# Altium footprint library LUMI_Handy_Soldering_LIB.PcbLib: 562 footprints (part 11 of 36)
Each footprint in its own frame and in the unit in brackets; x right, y up, seen from the top. Pads: shape width x height; smd on the part's side, far side on the other; paste and mask are expansions set on the pad; w line width, h text height; cw(c..) or ccw(c..) is an arc to the next point about the centre after c.
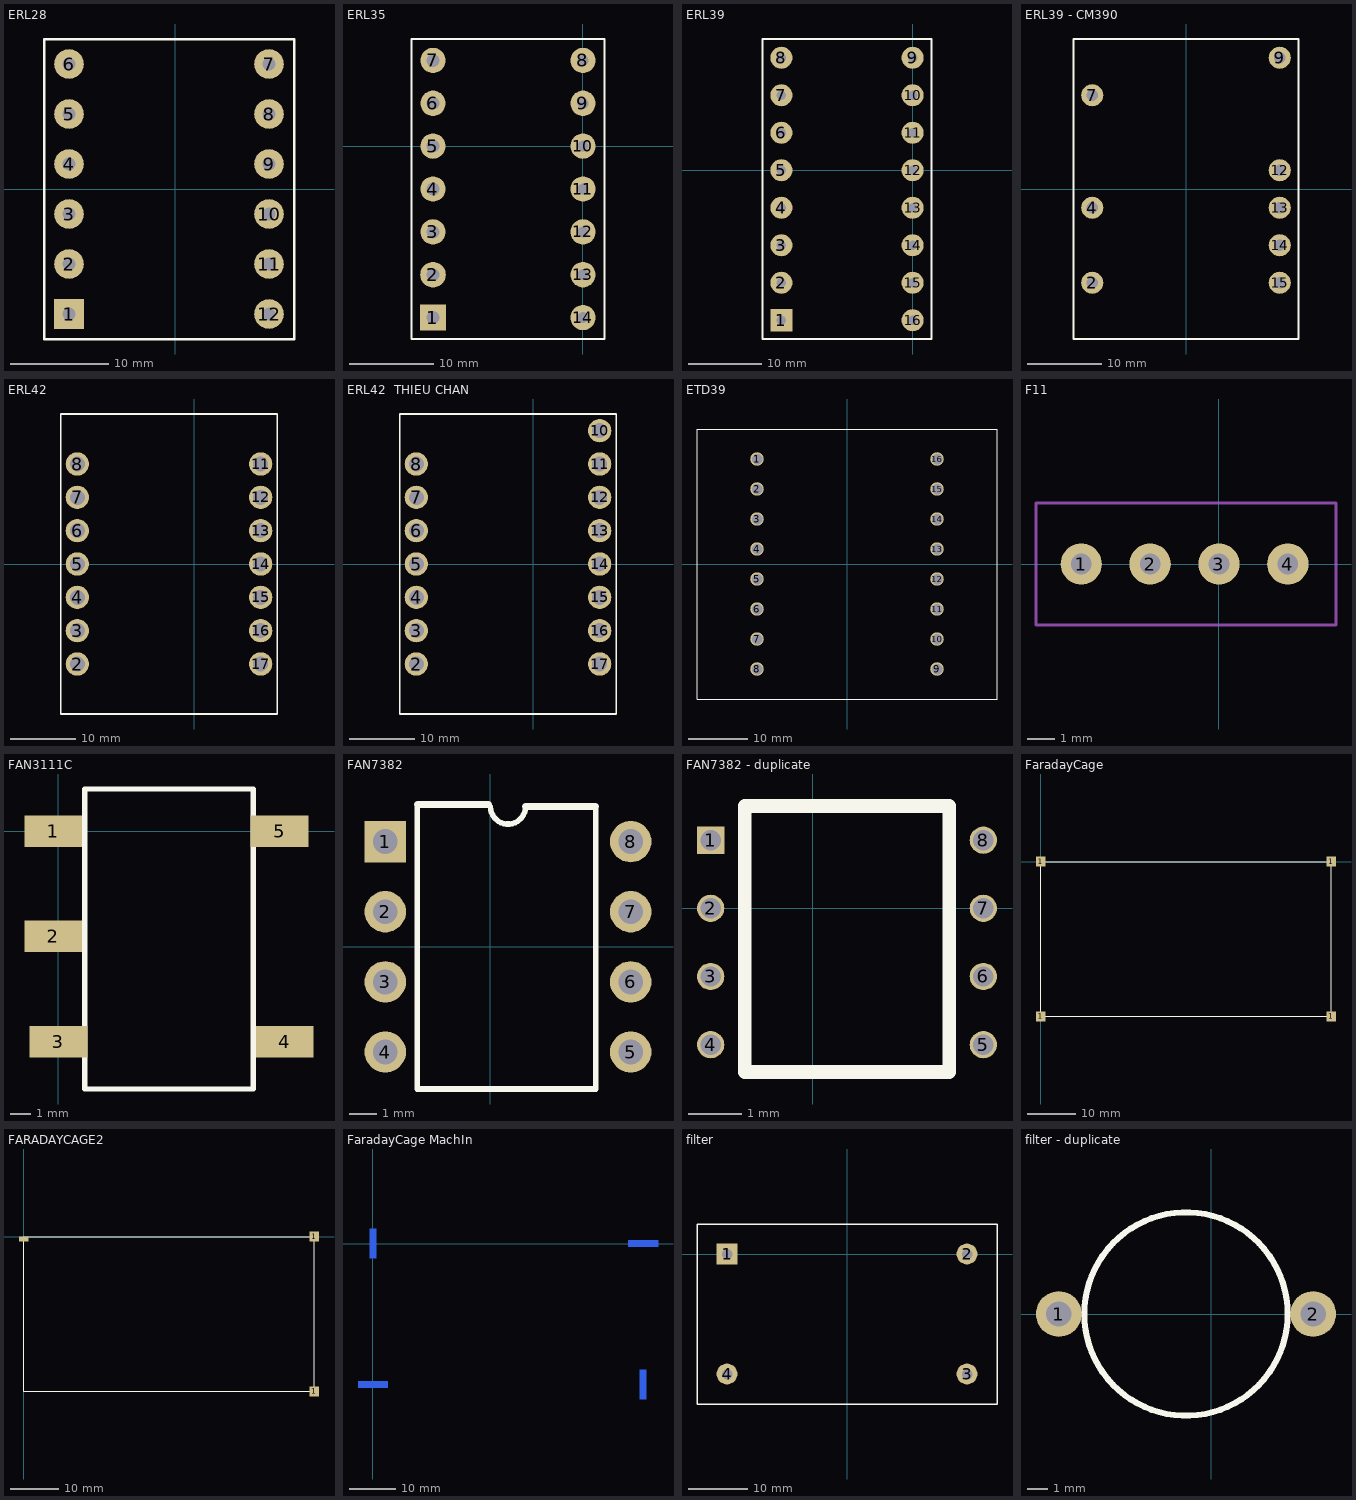
[diagram p10: the footprints below, top view; thin cyan lines are the x and y axes]

## ERL28 [mm]
pads (12):
  rect 3x3 hole 1.3: 1(-10.795,-12.7)
  round 3 hole 1.3: 2(-10.795,-7.62) 3(-10.795,-2.54) 4(-10.795,2.54) 5(-10.795,7.62) 6(-10.795,12.7) 7(9.525,12.7) 8(9.525,7.62) 9(9.525,2.54) 10(9.525,-2.54) 11(9.525,-7.62) 12(9.525,-12.7)
Top Overlay:
  lines w0.254: -13.335,-15.24 -13.335,15.24 12.065,15.24 12.065,-15.24 -13.335,-15.24
3D body: height 5.08, standoff 0, extent -7.62,-15.24 -5.715,15.24
3D body: height 5.08, standoff 0, extent 4.445,-15.24 6.35,15.24
3D body: height 10.16, standoff 5.08, extent 4.445,10.16 12.065,15.24
3D body: height 10.16, standoff 5.08, extent 4.445,5.08 12.065,10.16
3D body: height 10.16, standoff 5.08, extent 4.445,0 12.065,5.08
3D body: height 10.16, standoff 5.08, extent 4.445,-5.08 12.065,0
3D body: height 10.16, standoff 5.08, extent 4.445,-10.16 12.065,-5.08
3D body: height 10.16, standoff 5.08, extent 4.445,-15.24 12.065,-10.16
3D body: height 10.16, standoff 5.08, extent -13.335,-15.24 -5.715,-10.16
3D body: height 10.16, standoff 5.08, extent -13.335,-10.16 -5.715,-5.08
3D body: height 10.16, standoff 5.08, extent -13.335,-5.08 -5.715,0
3D body: height 10.16, standoff 5.08, extent -13.335,0 -5.715,5.08
3D body: height 10.16, standoff 5.08, extent -13.335,5.08 -5.715,10.16
3D body: height 38.1, standoff 3.81, extent -5.715,-13.97 4.445,-8.89
3D body: height 43.18, standoff 38.1, extent -5.715,-13.97 4.445,13.97
3D body: height 7.62, standoff 1.27, extent -5.715,-13.97 4.445,13.97
3D body: height 38.1, standoff 10.16, extent -9.525,-8.852 8.185,8.893
3D body: height 38.1, standoff 3.81, extent -5.715,8.89 4.445,13.97
3D body: height 7.62, standoff -2.54, extent 8.769,11.94 10.287,13.461
3D body: height 7.62, standoff -2.54, extent 8.769,6.86 10.287,8.381
3D body: height 7.62, standoff -2.54, extent 8.769,1.78 10.287,3.301
3D body: height 7.62, standoff -2.54, extent 8.769,-3.3 10.287,-1.779
3D body: height 7.62, standoff -2.54, extent 8.769,-8.38 10.287,-6.859
3D body: height 7.62, standoff -2.54, extent 8.769,-13.46 10.287,-11.939
3D body: height 7.62, standoff -2.54, extent -11.551,-13.46 -10.033,-11.939
3D body: height 7.62, standoff -2.54, extent -11.551,-8.38 -10.033,-6.859
3D body: height 7.62, standoff -2.54, extent -11.551,-3.3 -10.033,-1.779
3D body: height 7.62, standoff -2.54, extent -11.551,1.78 -10.033,3.301
3D body: height 7.62, standoff -2.54, extent -11.551,6.86 -10.033,8.381
3D body: height 7.62, standoff -2.54, extent -11.551,11.94 -10.033,13.461
3D body: height 10.16, standoff 5.08, extent -13.335,10.16 -5.715,15.24
3D body: height 10.16, standoff 7.62, extent -5.715,-8.89 4.445,8.89

## ERL35 [mm]
pads (14):
  rect 3.048x3.048 hole 1.524: 1(-17.78,-20.32)
  round 3.048 hole 1.524: 2(-17.78,-15.24)
  round 3 hole 1.524: 3(-17.78,-10.16) 4(-17.78,-5.08) 5(-17.78,0) 6(-17.78,5.08) 7(-17.78,10.16)
  round 3 hole 1.3: 8(0,10.16) 9(0,5.08) 10(0,0) 11(0,-5.08) 12(0,-10.16) 13(0,-15.24) 14(0,-20.32)
Top Overlay:
  lines w0.254: -20.32,-22.86 2.54,-22.86 2.54,12.7 -20.32,12.7 -20.32,-22.86
3D body: height 10.16, standoff 8.89, extent -13.97,-15.24 -3.81,5.08
3D body: height 36.83, standoff 8.89, extent -17.78,-14.206 0.436,4.046
3D body: height 7.62, standoff 1.27, extent -13.97,-22.86 -3.81,12.7
3D body: height 43.18, standoff 36.83, extent -13.97,-22.86 -3.81,12.7
3D body: height 43.18, standoff 1.27, extent -13.97,5.08 -3.81,12.7
3D body: height 43.18, standoff 1.27, extent -13.97,-22.86 -3.81,-15.24
3D body: height 10.16, standoff 5.08, extent -20.256,7.62 -13.907,12.7
3D body: height 7.62, standoff -2.54, extent -18.536,9.4 -17.018,10.921
3D body: height 7.62, standoff -2.54, extent -18.536,4.32 -17.018,5.841
3D body: height 7.62, standoff -2.54, extent -18.536,-0.76 -17.018,0.761
3D body: height 7.62, standoff -2.54, extent -18.536,-5.84 -17.018,-4.319
3D body: height 7.62, standoff -2.54, extent -18.536,-10.92 -17.018,-9.399
3D body: height 7.62, standoff -2.54, extent -18.536,-16 -17.018,-14.479
3D body: height 7.62, standoff -2.54, extent -18.536,-21.08 -17.018,-19.559
3D body: height 7.62, standoff -2.54, extent -0.756,-21.08 0.762,-19.56
3D body: height 7.62, standoff -2.54, extent -0.756,-16 0.762,-14.48
3D body: height 7.62, standoff -2.54, extent -0.756,-10.92 0.762,-9.4
3D body: height 7.62, standoff -2.54, extent -0.756,-5.84 0.762,-4.319
3D body: height 7.62, standoff -2.54, extent -0.756,-0.76 0.762,0.761
3D body: height 7.62, standoff -2.54, extent -0.756,4.32 0.762,5.84
3D body: height 7.62, standoff -2.54, extent -0.756,9.4 0.762,10.92
3D body: height 5.08, standoff 0, extent -3.746,-22.86 -1.841,12.7
3D body: height 5.08, standoff 0, extent -15.811,-22.86 -13.906,12.7
3D body: height 10.16, standoff 5.08, extent -20.256,2.54 -13.907,7.62
3D body: height 10.16, standoff 5.08, extent -20.256,-2.54 -13.907,2.54
3D body: height 10.16, standoff 5.08, extent -20.256,-7.62 -13.907,-2.54
3D body: height 10.16, standoff 5.08, extent -20.256,-12.7 -13.907,-7.62
3D body: height 10.16, standoff 5.08, extent -20.256,-17.78 -13.907,-12.7
3D body: height 10.16, standoff 5.08, extent -20.256,-22.86 -13.907,-17.78
3D body: height 10.16, standoff 5.08, extent -3.874,-22.86 2.476,-17.78
3D body: height 10.16, standoff 5.08, extent -3.874,-17.78 2.476,-12.7
3D body: height 10.16, standoff 5.08, extent -3.873,-12.7 2.476,-7.62
3D body: height 10.16, standoff 5.08, extent -3.873,-7.62 2.476,-2.54
3D body: height 10.16, standoff 5.08, extent -3.873,-2.54 2.476,2.54
3D body: height 10.16, standoff 5.08, extent -3.874,2.54 2.476,7.62
3D body: height 10.16, standoff 5.08, extent -3.874,7.62 2.476,12.7

## ERL39 [mm]
pads (16):
  rect 3x3 hole 1.3: 1(-17.78,-20.32)
  round 3 hole 1.3: 2(-17.78,-15.24) 3(-17.78,-10.16) 4(-17.78,-5.08) 5(-17.78,0) 6(-17.78,5.08) 7(-17.78,10.16) 8(-17.78,15.24) 9(0,15.24) 10(0,10.16) 11(0,5.08) 12(0,0) 13(0,-5.08) 14(0,-10.16) 15(0,-15.24) 16(0,-20.32)
Top Overlay:
  lines w0.254: -20.32,-22.86 2.54,-22.86 2.54,17.78 -20.32,17.78 -20.32,-22.86
3D body: height 10.16, standoff 8.89, extent -13.97,-15.24 -3.81,5.08
3D body: height 38.1, standoff 10.16, extent -21.59,-15.215 3.71,10.135
3D body: height 7.62, standoff 1.27, extent -13.97,-22.86 -3.81,17.78
3D body: height 44.45, standoff 38.1, extent -13.97,-22.86 -3.81,17.78
3D body: height 43.18, standoff 1.27, extent -13.97,10.16 -3.81,17.78
3D body: height 43.18, standoff 1.27, extent -13.97,-22.86 -3.81,-15.24
3D body: height 10.16, standoff 5.08, extent -20.256,7.62 -13.907,12.7
3D body: height 7.62, standoff -2.54, extent -18.536,9.4 -17.018,10.921
3D body: height 7.62, standoff -2.54, extent -18.536,4.32 -17.018,5.841
3D body: height 7.62, standoff -2.54, extent -18.536,-0.76 -17.018,0.761
3D body: height 7.62, standoff -2.54, extent -18.536,-5.84 -17.018,-4.319
3D body: height 7.62, standoff -2.54, extent -18.536,-10.92 -17.018,-9.399
3D body: height 7.62, standoff -2.54, extent -18.536,-16 -17.018,-14.479
3D body: height 7.62, standoff -2.54, extent -18.536,-21.08 -17.018,-19.559
3D body: height 7.62, standoff -2.54, extent -0.756,-21.08 0.762,-19.56
3D body: height 7.62, standoff -2.54, extent -0.756,-16 0.762,-14.48
3D body: height 7.62, standoff -2.54, extent -0.756,-10.92 0.762,-9.4
3D body: height 7.62, standoff -2.54, extent -0.756,-5.84 0.762,-4.319
3D body: height 7.62, standoff -2.54, extent -0.756,-0.76 0.762,0.761
3D body: height 7.62, standoff -2.54, extent -0.756,4.32 0.762,5.84
3D body: height 7.62, standoff -2.54, extent -0.756,9.4 0.762,10.92
3D body: height 5.08, standoff 0, extent -3.746,-22.86 -1.841,12.7
3D body: height 5.08, standoff 0, extent -15.811,-22.86 -13.906,12.7
3D body: height 10.16, standoff 5.08, extent -20.256,2.54 -13.907,7.62
3D body: height 10.16, standoff 5.08, extent -20.256,-2.54 -13.907,2.54
3D body: height 10.16, standoff 5.08, extent -20.256,-7.62 -13.907,-2.54
3D body: height 10.16, standoff 5.08, extent -20.256,-12.7 -13.907,-7.62
3D body: height 10.16, standoff 5.08, extent -20.256,-17.78 -13.907,-12.7
3D body: height 10.16, standoff 5.08, extent -20.256,-22.86 -13.907,-17.78
3D body: height 10.16, standoff 5.08, extent -3.874,-22.86 2.476,-17.78
3D body: height 10.16, standoff 5.08, extent -3.874,-17.78 2.476,-12.7
3D body: height 10.16, standoff 5.08, extent -3.873,-12.7 2.476,-7.62
3D body: height 10.16, standoff 5.08, extent -3.873,-7.62 2.476,-2.54
3D body: height 10.16, standoff 5.08, extent -3.873,-2.54 2.476,2.54
3D body: height 10.16, standoff 5.08, extent -3.874,2.54 2.476,7.62
3D body: height 10.16, standoff 5.08, extent -3.874,7.62 2.476,12.7
3D body: height 10.16, standoff 5.08, extent -20.256,12.7 -13.907,17.78
3D body: height 10.16, standoff 5.08, extent -3.873,12.7 2.476,17.78
3D body: height 7.62, standoff -2.54, extent -18.536,-21.08 -17.018,-19.559
3D body: height 7.62, standoff -2.54, extent -0.756,-21.08 0.762,-19.559
3D body: height 7.62, standoff -2.54, extent -0.756,-21.08 0.762,-19.56
3D body: height 7.62, standoff -2.54, extent -18.536,-21.08 -17.018,-19.56
3D body: height 7.62, standoff -2.54, extent -18.536,14.48 -17.018,16
3D body: height 7.62, standoff -2.54, extent -0.756,14.48 0.762,16

## ERL39 - CM390 [mm]
pads (8):
  round 3 hole 1.524: 2(-12.7,-12.7) 4(-12.7,-2.54) 7(-12.7,12.7) 9(12.7,17.78) 12(12.7,2.54) 13(12.7,-2.54) 14(12.7,-7.62) 15(12.7,-12.7)
Top Overlay:
  lines w0.254: -15.24,-20.32 15.24,-20.32 15.24,20.32 -15.24,20.32 -15.24,-20.32

## ERL42 [mil]
pads (14):
  round 140 hole 90: 2(-700,-600) 3(-700,-400) 4(-700,-200) 5(-700,0) 6(-700,200) 7(-700,400) 8(-700,600) 11(400,600) 12(400,400) 13(400,200) 14(400,0) 15(400,-200) 16(400,-400) 17(400,-600)
Top Overlay:
  region: -720,640
  lines w10: -800,-900 -800,900 500,900 500,-900 -800,-900
3D body: height 400, standoff 200, extent -797.5,-900 -450,-700
3D body: height 400, standoff 200, extent -797.5,-700 -450,-500
3D body: height 400, standoff 200, extent -797.5,-500 -450,-300
3D body: height 400, standoff 200, extent -797.5,-300 -450,-100
3D body: height 400, standoff 200, extent -797.5,-100 -450,100
3D body: height 400, standoff 200, extent -797.5,100 -450,300
3D body: height 400, standoff 200, extent -797.5,300 -450,500
3D body: height 400, standoff 200, extent -797.5,500 -450,700
3D body: height 400, standoff 200, extent -797.5,700 -450,900
3D body: height 400, standoff 200, extent 150,-900 497.5,-700
3D body: height 400, standoff 200, extent 150,-700 497.5,-500
3D body: height 400, standoff 200, extent 150,-500 497.5,-300
3D body: height 400, standoff 200, extent 150,-300 497.5,-100
3D body: height 400, standoff 200, extent 150,-100 497.5,100
3D body: height 400, standoff 200, extent 150,100 497.5,300
3D body: height 400, standoff 200, extent 150,300 497.5,500
3D body: height 400, standoff 200, extent 150,500 497.5,700
3D body: height 200, standoff 0, extent -522.5,-900 -447.5,900
3D body: height 200, standoff 0, extent 150,-900 225,900
3D body: height 300, standoff -100, extent -729.76,570.06 -670,629.94
3D body: height 300, standoff -100, extent -729.76,-829.94 -670,-770.06
3D body: height 300, standoff -100, extent -729.76,-829.93 -669.99,-770.05
3D body: height 200, standoff 0, extent 147.5,-900 222.5,900
3D body: height 300, standoff -100, extent -729.76,-829.93 -669.99,-770.05
3D body: height 300, standoff -100, extent -729.76,-629.93 -669.99,-570.05
3D body: height 300, standoff -100, extent -729.76,-429.93 -669.99,-370.05
3D body: height 300, standoff -100, extent -729.76,-229.93 -669.99,-170.05
3D body: height 300, standoff -100, extent -729.76,-29.93 -670,29.95
3D body: height 300, standoff -100, extent -729.76,170.07 -669.99,229.95
3D body: height 300, standoff -100, extent -729.76,370.07 -669.99,429.95
3D body: height 1600, standoff 200, extent -450,-900 150,-600
3D body: height 1700, standoff 50, extent -449.99,600 150,900
3D body: height 1750, standoff 1500, extent -450,-900 150,900
3D body: height 300, standoff 50, extent -450,-900 150,900.01
3D body: height 1500, standoff 400, extent -748.03,-597.83 447.24,599.8
3D body: height 400, standoff 200, extent 150,700 497.5,900
3D body: height 300, standoff -100, extent 370.24,-629.94 430,-570.06
3D body: height 300, standoff -100, extent 370.24,-429.94 430,-370.06
3D body: height 300, standoff -100, extent 370.24,-229.94 430,-170.06
3D body: height 300, standoff -100, extent 370.24,-29.94 430,29.94
3D body: height 300, standoff -100, extent 370.24,370.06 430,429.94
3D body: height 300, standoff -100, extent 370.24,570.06 430,629.94
3D body: height 300, standoff -100, extent -729.76,770.06 -670,829.94
3D body: height 300, standoff -100, extent -729.76,-229.94 -670,-170.06
3D body: height 300, standoff -100, extent 370.24,-229.94 430,-170.06
3D body: height 300, standoff -100, extent 370.24,170.06 430,229.94
3D body: height 300, standoff -100, extent 370.24,770.06 430,829.94
3D body: height 300, standoff -100, extent 370.24,-829.94 430,-770.06

## ERL42  THIEU CHAN [mil]
pads (15):
  round 140 hole 90: 2(-700,-600) 3(-700,-400) 4(-700,-200) 5(-700,0) 6(-700,200) 7(-700,400) 8(-700,600) 10(400,800) 11(400,600) 12(400,400) 13(400,200) 14(400,0) 15(400,-200) 16(400,-400) 17(400,-600)
Top Overlay:
  region: -720,640
  lines w10: -800,-900 -800,900 500,900 500,-900 -800,-900
3D body: height 300, standoff -100, extent 370.24,770.06 430,829.94
3D body: height 400, standoff 200, extent -797.5,-900 -450,-700
3D body: height 400, standoff 200, extent -797.5,-700 -450,-500
3D body: height 400, standoff 200, extent -797.5,-500 -450,-300
3D body: height 400, standoff 200, extent -797.5,-300 -450,-100
3D body: height 400, standoff 200, extent -797.5,-100 -450,100
3D body: height 400, standoff 200, extent -797.5,100 -450,300
3D body: height 400, standoff 200, extent -797.5,300 -450,500
3D body: height 400, standoff 200, extent -797.5,500 -450,700
3D body: height 400, standoff 200, extent -797.5,700 -450,900
3D body: height 400, standoff 200, extent 150,-900 497.5,-700
3D body: height 400, standoff 200, extent 150,-700 497.5,-500
3D body: height 400, standoff 200, extent 150,-500 497.5,-300
3D body: height 400, standoff 200, extent 150,-300 497.5,-100
3D body: height 400, standoff 200, extent 150,-100 497.5,100
3D body: height 400, standoff 200, extent 150,100 497.5,300
3D body: height 400, standoff 200, extent 150,300 497.5,500
3D body: height 400, standoff 200, extent 150,500 497.5,700
3D body: height 200, standoff 0, extent -522.5,-900 -447.5,900
3D body: height 200, standoff 0, extent 150,-900 225,900
3D body: height 300, standoff -100, extent -729.76,570.06 -670,629.94
3D body: height 200, standoff 0, extent 147.5,-900 222.5,900
3D body: height 300, standoff -100, extent -729.76,-629.93 -669.99,-570.05
3D body: height 300, standoff -100, extent -729.76,-429.93 -669.99,-370.05
3D body: height 300, standoff -100, extent -729.76,-229.93 -669.99,-170.05
3D body: height 300, standoff -100, extent -729.76,-29.93 -670,29.95
3D body: height 300, standoff -100, extent -729.76,170.07 -669.99,229.95
3D body: height 300, standoff -100, extent -729.76,370.07 -669.99,429.95
3D body: height 1600, standoff 200, extent -450,-900 150,-600
3D body: height 1700, standoff 50, extent -449.99,600 150,900
3D body: height 1750, standoff 1500, extent -450,-900 150,900
3D body: height 300, standoff 50, extent -450,-900 150,900.01
3D body: height 1500, standoff 400, extent -748.03,-597.83 447.24,599.8
3D body: height 400, standoff 200, extent 150,700 497.5,900
3D body: height 300, standoff -100, extent 370.24,-629.94 430,-570.06
3D body: height 300, standoff -100, extent 370.24,-429.94 430,-370.06
3D body: height 300, standoff -100, extent 370.24,-229.94 430,-170.06
3D body: height 300, standoff -100, extent 370.24,-29.94 430,29.94
3D body: height 300, standoff -100, extent 370.24,370.06 430,429.94
3D body: height 300, standoff -100, extent 370.24,570.06 430,629.94
3D body: height 300, standoff -100, extent -729.76,-229.94 -670,-170.06
3D body: height 300, standoff -100, extent 370.24,-229.94 430,-170.06
3D body: height 300, standoff -100, extent 370.24,170.06 430,229.94

## ETD39 [mil]
pads (16):
  round 90 hole 70: 1(-600,700) 2(-600,500) 3(-600,300) 4(-600,100) 5(-600,-100) 6(-600,-300) 7(-600,-500) 8(-600,-700) 9(600,-700) 10(600,-500) 11(600,-300) 12(600,-100) 13(600,100) 14(600,300) 15(600,500) 16(600,700)
Top Overlay:
  lines w0.5: -1000,-900 1000,-900 1000,900 -1000,900 -1000,-900
3D body: height 1298.82, standoff -135.83, extent -841.37,-798.5 892.48,776.51

## F11 [mil]
pads (4):
  round 60 hole 30: 1(-200,0) 2(-100,0) 3(0,0) 4(100,0)
Mechanical 1:
  lines w3.94: -265.75,-88.58 170,-88.58 170,88.58 -265.75,88.58 -265.75,-88.58
3D body: height 39.37, standoff -39.37, extent 88.28,-11.79 111.81,11.79
3D body: height 39.37, standoff -39.37, extent -11.72,-11.79 11.81,11.79
3D body: height 39.37, standoff -39.37, extent -111.72,-11.79 -88.19,11.79
3D body: height 39.37, standoff -39.37, extent -211.72,-11.79 -188.19,11.79
3D body: height 133.86, standoff 0, extent -265.75,-88.58 170,88.58

## FAN3111C [mil]
pads (5):
  rect 110x60 smd: 1(-10,0) 2(-10,-200) 3(0,-400) 4(430,-400) 5(420,0)
Top Overlay:
  lines w10: 50,-490 50,80 370,80 370,-490 50,-490

## FAN7382 [mm] "DIP; 8 Leads; Row Spacing 7.62 mm; Pitch 2.54 mm"
height 5.08
pads (8):
  rect 1.5x1.5 hole 0.9: 1(-3.81,3.81)
  round 1.5 hole 0.9: 2(-3.81,1.27) 3(-3.81,-1.27) 4(-3.81,-3.81) 5(5.08,-3.81) 6(5.08,-1.27) 7(5.08,1.27) 8(5.08,3.81)
Top Overlay:
  lines w0.2: -2.65,5.15 -2.65,-5.15 3.81,-5.15 3.81,5.08 ; 0,5.08 ccw(c0.635,5.08) 1.27,5.08
  lines w0.254: -2.65,5.15 -0.07,5.15 ; 1.27,5.08 3.81,5.08

## FAN7382 - duplicate [mil]
pads (8):
  rect 20x20 hole 15: 1(-75,50)
  round 20 hole 15: 2(-75,0) 3(-75,-50) 4(-75,-100) 5(125,-100) 6(125,-50) 7(125,0) 8(125,50)
Top Overlay:
  lines w10: -50,-120 -50,-100 -50,75 ; -50,-120 -50,75 ; -50,-120 100,-120 100,75 -50,75

## FaradayCage [mm]
pads (4):
  rect 2x2 smd: 1(0,-32) 1(0,0) 1(60,-32) 1(60,0)
Top Overlay:
  lines w0.127: 0,-32 60,-32 60,0 0,0 0,-32

## FARADAYCAGE2 [mm]
pads (3):
  rect 2x1 smd: 1(0,-0.483)
  rect 2x2 smd: 1(60,-32) 1(60,0)
Top Overlay:
  lines w0.127: 0,-32 0,0 60,0 60,-32 0,-32

## FaradayCage MachIn [mm]
pads (4):
  rect 6.4x1.4 smd far side: 1(0,-30.5) 1(58.5,0)
  rect 1.4x6.4 smd far side: 1(0,0) 1(58.5,-30.5)
Bottom Overlay:
  lines w0.127: -1.5,-32 60,-32 60,1.5 -1.5,1.5 -1.5,-32
3D body: height -0.4, standoff -6.8, extent 55.748,-0.635 61.252,0.635
3D body: height -0.4, standoff -6.8, extent 57.865,-33.252 59.135,-27.748
3D body: height -0.4, standoff -6.8, extent -2.752,-31.135 2.752,-29.865
3D body: height -0.4, standoff -6.8, extent -0.635,-2.752 0.635,2.752

## filter [mil]
pads (4):
  rect 140x140 hole 70: 1(-800,0)
  round 140 hole 70: 2(800,0) 3(800,-800) 4(-800,-800)
Top Overlay:
  lines w10: -1000,-1000 1000,-1000 1000,200 -1000,200 -1000,-1000

## filter - duplicate [mil]
pads (2):
  round 90 hole 50: 1(-300,0) 2(200,0)
Top Overlay:
  circle w12: c-50,0 r200
  lines w10: -300,0 -250,0 ; 150,0 200,0
3D body: height 440.94, standoff -196.85, extent -213.38,-163.38 113.39,163.39